# Altium footprint library Apalis Evaluation Board.PcbLib: 166 footprints (part 9 of 11)
Each footprint in its own frame and in the unit in brackets; x right, y up, seen from the top. Pads: shape width x height; smd on the part's side, far side on the other; paste and mask are expansions set on the pad; w line width, h text height; cw(c..) or ccw(c..) is an arc to the next point about the centre after c.
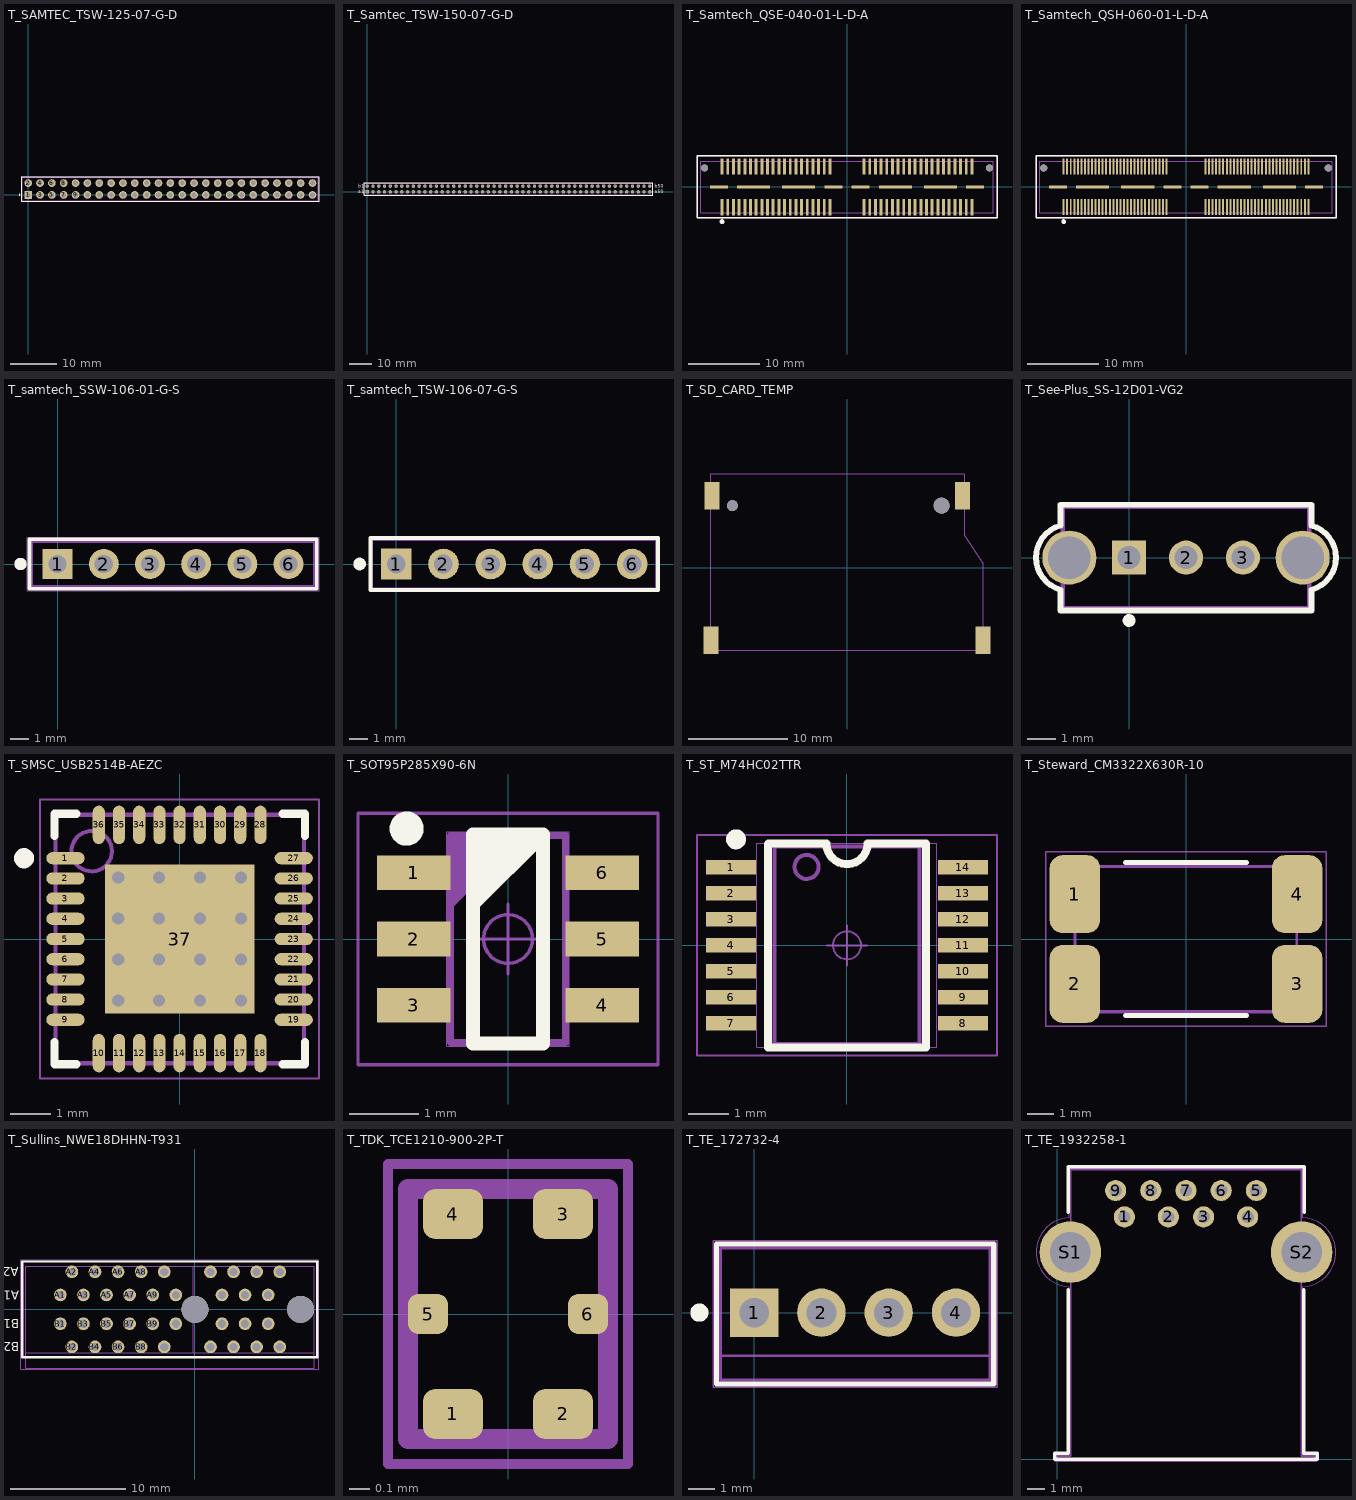
[diagram p8: the footprints below, top view; thin cyan lines are the x and y axes]

## T_SAMTEC_TSW-125-07-G-D [mm] "Header, 2x25 Pins, 2.54 mm pitch"
height 8.51
pads (50):
  rect 1.65x1.65 hole 1.016: 1(0,0)
  round 1.65 hole 1.016: 2(0,2.54)
  round 1.65 hole 1: 3(2.54,0) 4(2.54,2.54) 5(5.08,0) 6(5.08,2.54) 7(7.62,0) 8(7.62,2.54) 9(10.16,0) 10(10.16,2.54) 11(12.7,0) 12(12.7,2.54) 13(15.24,0) 14(15.24,2.54) 15(17.78,0) 16(17.78,2.54) 17(20.32,0) 18(20.32,2.54) 19(22.86,0) 20(22.86,2.54) 21(25.4,0) 22(25.4,2.54) 23(27.94,0) 24(27.94,2.54) 25(30.48,0) 26(30.48,2.54) 27(33.02,0) 28(33.02,2.54) 29(35.56,0) 30(35.56,2.54) 31(38.1,0) 32(38.1,2.54) 33(40.64,0) 34(40.64,2.54) 35(43.18,0) 36(43.18,2.54) 37(45.72,0) 38(45.72,2.54) 39(48.26,0) 40(48.26,2.54) 41(50.8,0) 42(50.8,2.54) 43(53.34,0) 44(53.34,2.54) 45(55.88,0) 46(55.88,2.54) 47(58.42,0) 48(58.42,2.54) 49(60.96,0) 50(60.96,2.54)
Top Overlay:
  circle w0.25: c-1.871,0 r0.1
  lines w0.2: -1.395,-1.395 -1.395,3.935 62.355,3.935 62.355,-1.395 -1.395,-1.395
Mechanical 1:
  circle w0.05: c0,0 r0.35
  lines w0.05: -0.5,0 0.5,0 ; 0,-0.5 0,0.5 ; -1.37,-1.369 62.33,-1.369 62.33,3.91 -1.37,3.91 -1.37,-1.369
Mechanical 2:
  lines w0.001: -1.27,-1.27 -1.27,3.81 62.23,3.81 62.23,-1.27 -1.27,-1.27
Mechanical 3:
  lines w0.1: -1.37,-1.369 -1.37,3.91 62.33,3.91 62.33,-1.369 -1.37,-1.369
3D body: height 8.38, standoff -2.54, extent -1.27,-1.27 62.23,3.81

## T_Samtec_TSW-150-07-G-D [mm] "Header 2x50 pin 2.54mm pitch"
height 10.8
pads (100):
  rect 1.5x1.5 hole 1: 1(0,0)
  round 1.5 hole 1: 2(0,2.54) 3(2.54,0) 4(2.54,2.54) 5(5.08,0) 6(5.08,2.54) 7(7.62,0) 8(7.62,2.54) 9(10.16,0) 10(10.16,2.54) 11(12.7,0) 12(12.7,2.54) 13(15.24,0) 14(15.24,2.54) 15(17.78,0) 16(17.78,2.54) 17(20.32,0) 18(20.32,2.54) 19(22.86,0) 20(22.86,2.54) 21(25.4,0) 22(25.4,2.54) 23(27.94,0) 24(27.94,2.54) 25(30.48,0) 26(30.48,2.54) 27(33.02,0) 28(33.02,2.54) 29(35.56,0) 30(35.56,2.54) 31(38.1,0) 32(38.1,2.54) 33(40.64,0) 34(40.64,2.54) 35(43.18,0) 36(43.18,2.54) 37(45.72,0) 38(45.72,2.54) 39(48.26,0) 40(48.26,2.54) 41(50.8,0) 42(50.8,2.54) 43(53.34,0) 44(53.34,2.54) 45(55.88,0) 46(55.88,2.54) 47(58.42,0) 48(58.42,2.54) 49(60.96,0) 50(60.96,2.54) 51(63.5,0) 52(63.5,2.54) 53(66.04,0) 54(66.04,2.54) 55(68.58,0) 56(68.58,2.54) 57(71.12,0) 58(71.12,2.54) 59(73.66,0) 60(73.66,2.54) 61(76.2,0) 62(76.2,2.54) 63(78.74,0) 64(78.74,2.54) 65(81.28,0) 66(81.28,2.54) 67(83.82,0) 68(83.82,2.54) 69(86.36,0) 70(86.36,2.54) 71(88.9,0) 72(88.9,2.54) 73(91.44,0) 74(91.44,2.54) 75(93.98,0) 76(93.98,2.54) 77(96.52,0) 78(96.52,2.54) 79(99.06,0) 80(99.06,2.54) 81(101.6,0) 82(101.6,2.54) 83(104.14,0) 84(104.14,2.54) 85(106.68,0) 86(106.68,2.54) 87(109.22,0) 88(109.22,2.54) 89(111.76,0) 90(111.76,2.54) 91(114.3,0) 92(114.3,2.54) 93(116.84,0) 94(116.84,2.54) 95(119.38,0) 96(119.38,2.54) 97(121.92,0) 98(121.92,2.54) 99(124.46,0) 100(124.46,2.54)
Top Overlay:
  lines w0.2: -1.395,-1.395 125.855,-1.395 125.855,3.935 -1.395,3.935 -1.395,-1.395
  text "a50" at 126.55,-0.65 h1.52
  text "b50" at 126.55,1.85 h1.52
  text "b1" at -4.07,1.82 h1.52
  text "a1" at -4.069,-0.7 h1.52
Mechanical 1:
  lines w0.05: -1.37,-1.37 125.83,-1.37 125.83,3.91 -1.37,3.91 -1.37,-1.37
Mechanical 2:
  lines w0.001: -1.27,-1.27 125.73,-1.27 125.73,3.81 -1.27,3.81 -1.27,-1.27
Mechanical 3:
  lines w0.1: -1.37,-1.37 -1.37,3.91 125.83,3.91 125.83,-1.37 -1.37,-1.37
3D body: height 8.4, standoff -2.52, extent -1.27,-1.27 125.73,3.81

## T_Samtech_QSE-040-01-L-D-A [mm] "High Speed Ground Plane Socket"
height 3.25
pads (90):
  round 1 hole 1.02 unplated: 0(-20.065,2.67) ""(20.065,2.67)
  rect 0.41x2.27 smd mask+0.05: 1(-17.6,-2.87) 2(-17.6,2.87) 3(-16.8,-2.87) 4(-16.8,2.87) 5(-16,-2.87) 6(-16,2.87) 7(-15.2,-2.87) 8(-15.2,2.87) 9(-14.4,-2.87) 10(-14.4,2.87) 11(-13.6,-2.87) 12(-13.6,2.87) 13(-12.8,-2.87) 14(-12.8,2.87) 15(-12,-2.87) 16(-12,2.87) 17(-11.2,-2.87) 18(-11.2,2.87) 19(-10.4,-2.87) 20(-10.4,2.87) 21(-9.6,-2.87) 22(-9.6,2.87) 23(-8.8,-2.87) 24(-8.8,2.87) 25(-8,-2.87) 26(-8,2.87) 27(-7.2,-2.87) 28(-7.2,2.87) 29(-6.4,-2.87) 30(-6.4,2.87) 31(-5.6,-2.87) 32(-5.6,2.87) 33(-4.8,-2.87) 34(-4.8,2.87) 35(-4,-2.87) 36(-4,2.87) 37(-3.2,-2.87) 38(-3.2,2.87) 39(-2.4,-2.87) 40(-2.4,2.87) 41(2.4,-2.87) 42(2.4,2.87) 43(3.2,-2.87) 44(3.2,2.87) 45(4,-2.87) 46(4,2.87) 47(4.8,-2.87) 48(4.8,2.87) 49(5.6,-2.87) 50(5.6,2.87) 51(6.4,-2.87) 52(6.4,2.87) 53(7.2,-2.87) 54(7.2,2.87) 55(8,-2.87) 56(8,2.87) 57(8.8,-2.87) 58(8.8,2.87) 59(9.6,-2.87) 60(9.6,2.87) 61(10.4,-2.87) 62(10.4,2.87) 63(11.2,-2.87) 64(11.2,2.87) 65(12,-2.87) 66(12,2.87) 67(12.8,-2.87) 68(12.8,2.87) 69(13.6,-2.87) 70(13.6,2.87) 71(14.4,-2.87) 72(14.4,2.87) 73(15.2,-2.87) 74(15.2,2.87) 75(16,-2.87) 76(16,2.87) 77(16.8,-2.87) 78(16.8,2.87) 79(17.6,-2.87) 80(17.6,2.87)
  rect 2.54x0.43 smd mask+0.05: 81(-18.065,0) 81(-1.935,0) 81(1.935,0) 81(18.065,0)
  rect 4.7x0.43 smd mask+0.05: 81(-13.175,0) 81(-6.825,0) 81(6.825,0) 81(13.175,0)
Top Overlay:
  circle w0.5: c-17.6,-4.9 r0.088
  lines w0.2: -21.135,-4.38 21.135,-4.38 21.135,4.38 -21.135,4.38 -21.135,-4.38
Mechanical 1:
  lines w0.05: -21.135,-4.38 21.135,-4.38 21.135,4.38 -21.135,4.38 -21.135,-4.38
Mechanical 2:
  lines w0.01: -20.635,-3.62 20.635,-3.62 20.635,3.62 -20.635,3.62 -20.635,-3.62
Mechanical 3:
  lines w0.1: -20.635,-3.62 20.635,-3.62 20.635,3.62 -20.635,3.62 -20.635,-3.62
3D body: height 3.06, standoff -0.49, extent -20.635,-3.747 20.64,3.746

## T_Samtech_QSH-060-01-L-D-A [mm] "High Speed Ground Plane Socket"
height 3.25
pads (130):
  rect 0.28x2.27 smd: 1(-17.25,-2.865) 2(-17.25,2.865) 3(-16.75,-2.865) 4(-16.75,2.865) 5(-16.25,-2.865) 6(-16.25,2.865) 7(-15.75,-2.865) 8(-15.75,2.865) 9(-15.25,-2.865) 10(-15.25,2.865) 11(-14.75,-2.865) 12(-14.75,2.865) 13(-14.25,-2.865) 14(-14.25,2.865) 15(-13.75,-2.865) 16(-13.75,2.865) 17(-13.25,-2.865) 18(-13.25,2.865) 19(-12.75,-2.865) 20(-12.75,2.865) 21(-12.25,-2.865) 22(-12.25,2.865) 23(-11.75,-2.865) 24(-11.75,2.865) 25(-11.25,-2.865) 26(-11.25,2.865) 27(-10.75,-2.865) 28(-10.75,2.865) 29(-10.25,-2.865) 30(-10.25,2.865) 31(-9.75,-2.865) 32(-9.75,2.865) 33(-9.25,-2.865) 34(-9.25,2.865) 35(-8.75,-2.865) 36(-8.75,2.865) 37(-8.25,-2.865) 38(-8.25,2.865) 39(-7.75,-2.865) 40(-7.75,2.865) 41(-7.25,-2.865) 42(-7.25,2.865) 43(-6.75,-2.865) 44(-6.75,2.865) 45(-6.25,-2.865) 46(-6.25,2.865) 47(-5.75,-2.865) 48(-5.75,2.865) 49(-5.25,-2.865) 50(-5.25,2.865) 51(-4.75,-2.865) 52(-4.75,2.865) 53(-4.25,-2.865) 54(-4.25,2.865) 55(-3.75,-2.865) 56(-3.75,2.865) 57(-3.25,-2.865) 58(-3.25,2.865) 59(-2.75,-2.865) 60(-2.75,2.865) 61(2.75,-2.865) 62(2.75,2.865) 63(3.25,-2.865) 64(3.25,2.865) 65(3.75,-2.865) 66(3.75,2.865) 67(4.25,-2.865) 68(4.25,2.865) 69(4.75,-2.865) 70(4.75,2.865) 71(5.25,-2.865) 72(5.25,2.865) 73(5.75,-2.865) 74(5.75,2.865) 75(6.25,-2.865) 76(6.25,2.865) 77(6.75,-2.865) 78(6.75,2.865) 79(7.25,-2.865) 80(7.25,2.865) 81(7.75,-2.865) 82(7.75,2.865) 83(8.25,-2.865) 84(8.25,2.865) 85(8.75,-2.865) 86(8.75,2.865) 87(9.25,-2.865) 88(9.25,2.865) 89(9.75,-2.865) 90(9.75,2.865) 91(10.25,-2.865) 92(10.25,2.865) 93(10.75,-2.865) 94(10.75,2.865) 95(11.25,-2.865) 96(11.25,2.865) 97(11.75,-2.865) 98(11.75,2.865) 99(12.25,-2.865) 100(12.25,2.865) 101(12.75,-2.865) 102(12.75,2.865) 103(13.25,-2.865) 104(13.25,2.865) 105(13.75,-2.865) 106(13.75,2.865) 107(14.25,-2.865) 108(14.25,2.865) 109(14.75,-2.865) 110(14.75,2.865) 111(15.25,-2.865) 112(15.25,2.865) 113(15.75,-2.865) 114(15.75,2.865) 115(16.25,-2.865) 116(16.25,2.865) 117(16.75,-2.865) 118(16.75,2.865) 119(17.25,-2.865) 120(17.25,2.865)
  rect 2.54x0.43 smd: 121(-18.065,0) 121(-1.935,0) 121(1.935,0) 121(18.065,0)
  rect 4.7x0.43 smd: 121(-13.175,0) 121(-6.825,0) 121(6.825,0) 121(13.175,0)
  round 1.02 hole 1.02 unplated: ""(-20.065,2.67) ""(20.065,2.67)
Top Overlay:
  circle w0.5: c-17.25,-4.895 r0.088
  lines w0.2: -21.15,-4.38 -21.15,4.38 21.15,4.38 21.15,-4.38 -21.15,-4.38
Mechanical 1:
  lines w0.05: -21.15,-4.38 21.15,-4.38 21.15,4.38 -21.15,4.38 -21.15,-4.38
Mechanical 2:
  lines w0.01: -20.65,-3.62 -20.65,3.62 20.65,3.62 20.65,-3.62 -20.65,-3.62
Mechanical 3:
  lines w0.1: -20.65,-3.62 20.65,-3.62 20.65,3.62 -20.65,3.62 -20.65,-3.62
3D body: height 3.27, standoff -0.29, extent -20.637,-3.746 20.638,3.747

## T_samtech_SSW-106-01-G-S [mm] "Receptacle Female Socket, 1x6 Pins, 2.54mm pitch"
height 8.51
pads (6):
  rect 1.65x1.65 hole 1: 1(0,0)
  round 1.65 hole 1: 2(2.54,0) 3(5.08,0) 4(7.62,0) 5(10.16,0) 6(12.7,0)
Top Overlay:
  circle w0.5: c-2.038,0 r0.088
  lines w0.2: -1.55,-1.355 14.25,-1.355 14.25,1.355 -1.55,1.355 -1.55,-1.355
Mechanical 1:
  lines w0.05: -1.675,-1.48 14.375,-1.48 14.375,1.48 -1.675,1.48 -1.675,-1.48
Mechanical 2:
  lines w0.01: -1.4,-1.205 -1.4,1.205 14.1,1.205 14.1,-1.205 -1.4,-1.205
Mechanical 3:
  lines w0.1: -1.4,-1.205 -1.4,1.205 14.1,1.205 14.1,-1.205 -1.4,-1.205
3D body: height 8.52, standoff -2.63, extent -1.524,-1.206 14.224,1.207

## T_samtech_TSW-106-07-G-S [mm] "Connector, Header, 6 Position, 2.54mm pitch"
height 8.4
pads (6):
  rect 1.65x1.65 hole 1: 1(0,0)
  round 1.65 hole 1: 2(2.54,0) 3(5.08,0) 4(7.62,0) 5(10.16,0) 6(12.7,0)
Top Overlay:
  circle w0.5: c-1.975,0 r0.088
  lines w0.2: -1.395,-1.395 -1.395,1.395 14.095,1.395 14.095,-1.395 -1.395,-1.395
Mechanical 1:
  lines w0.05: -1.37,-1.37 -1.37,1.37 14.07,1.37 14.07,-1.37 -1.37,-1.37
Mechanical 2:
  lines w0.01: -1.27,-1.27 -1.27,1.27 13.97,1.27 13.97,-1.27 -1.27,-1.27
Mechanical 3:
  lines w0.1: -1.37,-1.37 14.07,-1.37 14.07,1.37 -1.37,1.37 -1.37,-1.37

## T_SD_CARD_TEMP [mm]
height 2.85
pads (6):
  rect 1.5x2.8 smd: ""(-13.65,-7.25) ""(-13.53,7.25) ""(11.57,7.25) ""(13.65,-7.25)
  round 1.1 hole 1.1: ""(-11.5,6.25)
  round 1.6 hole 1.6: ""(9.5,6.25)
Mechanical 2:
  lines w0.001: -13.68,-8.25 -13.68,9.45 11.82,9.45 11.82,3.25 13.68,0.45 13.68,-8.25 -13.68,-8.25
3D body: height 2.85, standoff 0, extent -13.68,-8.25 13.68,9.45

## T_See-Plus_SS-12D01-VG2 [mm] "Slide Switch"
height 5.5
pads (5):
  rect 1.2x1.2 hole 0.8: 1(0,0)
  round 1.2 hole 0.8: 2(2,0) 3(4,0)
  round 1.9 hole 1.5: ""(-2.1,0) ""(6.1,0)
Top Overlay:
  circle w0.25: c0,-2.21 r0.1
  lines w0.2: -2.423,1.124 ccw(c-2.1,0) -2.422,-1.125 ; -2.41,-1.13 -2.41,-1.86 6.41,-1.86 6.41,-1.13 ; -2.41,1.13 -2.41,1.86 6.41,1.86 6.41,1.13 ; 6.422,1.125 cw(c6.1,0) 6.423,-1.124
Mechanical 1:
  lines w0.05: -2.38,-1.83 -2.38,1.83 6.38,1.83 6.38,-1.83 -2.38,-1.83
Mechanical 2:
  lines w0.001: -2.3,-1.75 -2.3,1.75 6.3,1.75 6.3,-1.75 -2.3,-1.75
Mechanical 3:
  lines w0.1: -2.3,-1.75 6.3,-1.75 6.3,1.75 -2.3,1.75 -2.3,-1.75
3D body: height 6.5, standoff 3.5, extent -0.711,-0.711 0.711,0.711
3D body: height 3.5, standoff 0, extent -2.3,-1.75 6.3,1.75

## T_SMSC_USB2514B-AEZC [mm] "QFN, 36-Leads, Body 6x6mm, Pitch 0.5mm, IPC High Density"
height 1
pads (37):
  oval 0.95x0.3 smd: 1(-2.825,2) 2(-2.825,1.5) 3(-2.825,1) 4(-2.825,0.5) 5(-2.825,0) 6(-2.825,-0.5) 7(-2.825,-1) 8(-2.825,-1.5) 9(-2.825,-2) 19(2.825,-2) 20(2.825,-1.5) 21(2.825,-1) 22(2.825,-0.5) 23(2.825,0) 24(2.825,0.5) 25(2.825,1) 26(2.825,1.5) 27(2.825,2)
  oval 0.3x0.95 smd: 10(-2,-2.825) 11(-1.5,-2.825) 12(-1,-2.825) 13(-0.5,-2.825) 14(0,-2.825) 15(0.5,-2.825) 16(1,-2.825) 17(1.5,-2.825) 18(2,-2.825) 28(2,2.825) 29(1.5,2.825) 30(1,2.825) 31(0.5,2.825) 32(0,2.825) 33(-0.5,2.825) 34(-1,2.825) 35(-1.5,2.825) 36(-2,2.825)
  rect 3.7x3.7 smd paste-3.7: 37(0,0)
via 1.52,1.52 diameter 0.6 hole 0.3
via 1.52,-1.52 diameter 0.6 hole 0.3
via -1.52,-1.52 diameter 0.6 hole 0.3
via -1.52,1.52 diameter 0.6 hole 0.3
via -0.507,1.52 diameter 0.6 hole 0.3
via 0.507,1.52 diameter 0.6 hole 0.3
via -1.52,0.507 diameter 0.6 hole 0.3
via -0.507,0.507 diameter 0.6 hole 0.3
via 0.507,0.507 diameter 0.6 hole 0.3
via 1.52,0.507 diameter 0.6 hole 0.3
via -1.52,-0.507 diameter 0.6 hole 0.3
via -0.507,-0.507 diameter 0.6 hole 0.3
via 0.507,-0.507 diameter 0.6 hole 0.3
via 1.52,-0.507 diameter 0.6 hole 0.3
via -0.507,-1.52 diameter 0.6 hole 0.3
via 0.507,-1.52 diameter 0.6 hole 0.3
Top Overlay:
  circle w0.25: c-3.85,2 r0.125
  lines w0.2: -3.1,-2.55 -3.1,-3.1 -2.55,-3.1 ; -3.1,2.55 -3.1,3.1 -2.55,3.1 ; 2.55,-3.1 3.1,-3.1 3.1,-2.55 ; 2.55,3.1 3.1,3.1 3.1,2.55
Top Paste:
  region: -1.778,0.762 -0.762,0.762 -0.762,1.778 -1.778,1.778
  region: -0.508,0.762 0.508,0.762 0.508,1.778 -0.508,1.778
  region: 0.762,1.778 0.762,0.762 1.778,0.762 1.778,1.778
  region: -1.778,-0.508 -0.762,-0.508 -0.762,0.508 -1.778,0.508
  region: -0.762,-1.778 -0.762,-0.762 -1.778,-0.762 -1.778,-1.778
  region: 0.508,-1.778 0.508,-0.762 -0.508,-0.762 -0.508,-1.778
  region: 1.778,-1.778 1.778,-0.762 0.762,-0.762 0.762,-1.778
  region: 0.509,-0.507 0.509,0.509 -0.507,0.509 -0.507,-0.507
  region: 1.778,-0.508 1.778,0.508 0.762,0.508 0.762,-0.508
Mechanical 1:
  lines w0.05: -3.45,-3.45 3.45,-3.45 3.45,3.45 -3.45,3.45 -3.45,-3.45
Mechanical 2:
  lines w0.001: -3.075,-3.075 3.075,-3.075 3.075,3.075 -3.075,3.075 -3.075,-3.075
Mechanical 3:
  circle w0.1: c-2.175,2.175 r0.5
  lines w0.1: -3.075,-3.075 -3.075,3.075 3.075,3.075 3.075,-3.075 -3.075,-3.075
3D body: height 0.91, standoff 0.01, extent -3.103,-3.103 3.103,3.103

## T_SOT95P285X90-6N [mm]
height 1.45
pads (6):
  rect 1.05x0.5 smd: 1(-1.35,0.95) 2(-1.35,0) 3(-1.35,-0.95) 4(1.35,-0.95) 5(1.35,0) 6(1.35,0.95)
Top Overlay:
  circle w0.25: c-1.453,1.582 r0.12
  lines w0.2: -0.5,0.5 0.5,1.5 ; -0.5,0.7 0.3,1.5 ; -0.5,0.9 0.1,1.5 ; -0.5,1.1 -0.1,1.5 ; -0.5,1.3 -0.3,1.5 ; 0.5,1.5 0.5,-1.5 -0.5,-1.5 -0.5,1.5 0.5,1.5
Mechanical 1:
  circle w0.05: c0,0 r0.35
  lines w0.05: -0.5,0 0.5,0 ; 0,-0.5 0,0.5 ; -2.15,-1.8 2.15,-1.8 2.15,1.8 -2.15,1.8 -2.15,-1.8
Mechanical 2:
  lines w0.001: -0.875,-1.535 0.875,-1.535 0.875,1.535 -0.875,1.535 -0.875,-1.535
Mechanical 3:
  lines w0.1: -0.825,0.485 0.175,1.485 ; -0.825,0.585 0.075,1.485 ; -0.825,0.685 -0.025,1.485 ; -0.825,0.785 -0.125,1.485 ; -0.825,0.885 -0.225,1.485 ; -0.825,0.985 -0.325,1.485 ; -0.825,1.085 -0.425,1.485 ; -0.825,1.185 -0.525,1.485 ; -0.825,1.285 -0.625,1.485 ; -0.825,1.385 -0.725,1.485 ; -0.825,-1.485 0.825,-1.485 0.825,1.485 -0.825,1.485 -0.825,-1.485
3D body: height 1.45, standoff 0, extent -0.875,-1.535 0.875,1.535

## T_ST_M74HC02TTR [mm] "Shrink Small Outline; 14 Leads; Body Width 4.4 mm; Pitch 0.65 mm"
height 1.15
pads (14):
  rect 1.26x0.36 smd: 1(-2.9,1.95) 2(-2.9,1.3) 3(-2.9,0.65) 4(-2.9,0) 5(-2.9,-0.65) 6(-2.9,-1.3) 7(-2.9,-1.95) 8(2.9,-1.95) 9(2.9,-1.3) 10(2.9,-0.65) 11(2.9,0) 12(2.9,0.65) 13(2.9,1.3) 14(2.9,1.95)
Top Overlay:
  circle w0.25: c-2.775,2.65 r0.125
  lines w0.2: -1.97,-2.55 -1.97,2.539 -1.959,2.55 -0.517,2.55 ccw(c0,2.55) 0.517,2.55 1.97,2.55 1.97,-2.55 -1.97,-2.55
Mechanical 1:
  circle w0.05: c0,0 r0.35
  lines w0.05: -0.5,0 0.5,0 ; 0,-0.5 0,0.5 ; -3.75,-2.75 -3.75,2.762 3.75,2.762 3.75,-2.75 -3.75,-2.75
Mechanical 2:
  lines w0.001: -2.25,-2.55 -2.25,2.55 2.25,2.55 2.25,-2.55 -2.25,-2.55
Mechanical 3:
  circle w0.1: c-1.008,1.961 r0.3
  lines w0.1: -1.817,-2.472 1.815,-2.472 1.815,2.466 -1.817,2.466 -1.817,-2.472
3D body: height 1.15, standoff 0, extent -2.25,-2.55 2.25,2.55

## T_Steward_CM3322X630R-10 [mm] "Common Mode Choke"
height 2.85
pads (4):
  rrect50% 1.91x2.95 smd: 1(-4.22,1.705) 2(-4.22,-1.705) 3(4.22,-1.705) 4(4.22,1.705)
Top Overlay:
  lines w0.2: -2.3,-2.902 2.3,-2.902 ; -2.3,2.904 2.3,2.904
Mechanical 1:
  lines w0.05: -5.316,-3.321 -5.316,3.321 5.316,3.321 5.316,-3.321 -5.316,-3.321
Mechanical 2:
  lines w0.001: -4.25,-2.8 -4.25,2.8 4.25,2.8 4.25,-2.8 -4.25,-2.8
Mechanical 3:
  lines w0.1: -4.2,-2.75 -4.2,2.75 4.2,2.75 4.2,-2.75 -4.2,-2.75

## T_Sullins_NWE18DHHN-T931 [mm] "PCIe X1 Slot"
height 8.8
pads (38):
  round 1.1 hole 0.7: A1(-11.65,1.25) A2(-10.65,3.25) A3(-9.65,1.25) A4(-8.65,3.25) A5(-7.65,1.25) A6(-6.65,3.25) A7(-5.65,1.25) A8(-4.65,3.25) A9(-3.65,1.25) A10(-2.65,3.25) A11(-1.65,1.25) A12(1.35,3.25) A13(2.35,1.25) A14(3.35,3.25) A15(4.35,1.25) A16(5.35,3.25) A17(6.35,1.25) A18(7.35,3.25) B1(-11.65,-1.25) B2(-10.65,-3.25) B3(-9.65,-1.25) B4(-8.65,-3.25) B5(-7.65,-1.25) B6(-6.65,-3.25) B7(-5.65,-1.25) B8(-4.65,-3.25) B9(-3.65,-1.25) B10(-2.65,-3.25) B11(-1.65,-1.25) B12(1.35,-3.25) B13(2.35,-1.25) B14(3.35,-3.25) B15(4.35,-1.25) B16(5.35,-3.25) B17(6.35,-1.25) B18(7.35,-3.25)
  round 2.35 hole 2.35 unplated paste+0 mask+0: ""(0,0) ""(9.15,0)
Top Overlay:
  lines w0.2: -14.95,-4.15 -14.95,4.15 10.6,4.15 10.6,-4.15 -14.95,-4.15
  text "B2" at -15.23,-2.835 h0.76
  text "B1" at -15.23,-0.869 h0.76
  text "A2" at -15.23,3.631 h0.76
  text "A1" at -15.23,1.631 h0.76
Mechanical 1:
  lines w0.05: -15.1,-5.2 10.75,-5.2 10.75,4.3 -15.1,4.3 -15.1,-5.2
Mechanical 2:
  lines w0.01: -14.65,-3.75 10.35,-3.75 ; -0.15,-3.75 -0.15,3.75 ; -14.65,-5.1 -14.65,3.75 10.35,3.75 10.35,-5.1 -14.65,-5.1
Mechanical 3:
  lines w0.1: -14.65,-3.75 10.35,-3.75 ; -14.65,-5.1 10.35,-5.1 10.35,3.75 -14.65,3.75 -14.65,-5.1
3D body: height 11.04, standoff -4.38, extent -14.63,-4.864 10.363,3.747

## T_TDK_TCE1210-900-2P-T [mm] "Common Mode Choke Super Speed"
height 0.57
pads (6):
  rrect50% 0.3x0.25 smd: 1(-0.275,-0.5) 2(0.275,-0.5) 3(0.275,0.5) 4(-0.275,0.5)
  rrect50% 0.2x0.2 smd: 5(-0.4,0) 6(0.4,0)
Mechanical 1:
  lines w0.05: -0.6,-0.75 -0.6,0.75 0.6,0.75 0.6,-0.75 -0.6,-0.75
Mechanical 2:
  lines w0.01: -0.5,-0.625 0.5,-0.625 0.5,0.625 -0.5,0.625 -0.5,-0.625
Mechanical 3:
  lines w0.1: -0.5,-0.625 0.5,-0.625 0.5,0.625 -0.5,0.625 -0.5,-0.625
3D body: height 0.57, standoff 0, extent -0.5,-0.625 0.5,0.625

## T_TE_172732-4 [mm] "Header vertical with kink, 1x4 Pins, 2.54mm pitch"
height 10.4
pads (4):
  rect 1.8x1.8 hole 1.1: 1(0,0)
  round 1.8 hole 1.1: 2(2.5,0) 3(5,0) 4(7.5,0)
Top Overlay:
  circle w0.5: c-2.038,0 r0.088
  lines w0.2: -1.4,-2.65 -1.4,2.55 8.9,2.55 8.9,-2.65 -1.4,-2.65
Mechanical 1:
  lines w0.05: -1.525,-2.775 -1.525,2.675 9.025,2.675 9.025,-2.775 -1.525,-2.775
Mechanical 2:
  lines w0.01: -1.25,-2.5 -1.25,2.4 8.75,2.4 8.75,-2.5 -1.25,-2.5
Mechanical 3:
  lines w0.1: -1.25,-1.6 8.75,-1.6 ; -1.25,-2.5 8.75,-2.5 8.75,2.4 -1.25,2.4 -1.25,-2.5
3D body: height 10.42, standoff -3.28, extent -1.25,-2.5 8.75,2.4

## T_TE_1932258-1 [mm] "USB 3.0, Type A"
height 7.25
pads (11):
  round 1.2 hole 0.7: 1(3.815,13.78) 2(6.315,13.78) 3(8.315,13.78) 4(10.815,13.78) 5(11.315,15.28) 6(9.315,15.28) 7(7.315,15.28) 8(5.315,15.28) 9(3.315,15.28)
  round 3.5 hole 2.3: S1(0.745,11.78) S2(13.885,11.78)
Top Overlay:
  lines w0.2: 0.615,9.65 0.615,0.36 -0.15,0.36 -0.15,0 14.78,0 14.78,0.36 14.015,0.36 14.015,9.65 ; 0.615,14.06 0.615,16.63 14.02,16.63 14.02,14.06
Mechanical 1:
  lines w0.05: 0.67,13.735 ccw(c0.75,11.779) 0.67,9.823 0.67,0.299 -0.105,0.299 -0.105,-0.099 14.735,-0.099 14.735,0.299 13.96,0.299 13.96,9.824 ccw(c13.88,11.78) 13.959,13.736 13.96,16.575 0.67,16.575 0.67,13.735
Mechanical 2:
  lines w0.001: 0,0 0,0.2 0.765,0.2 0.765,16.48 13.865,16.48 13.865,0.2 14.63,0.2 14.63,0 0,0
Mechanical 3:
  lines w0.1: 0,0 0,0.2 0.765,0.2 0.765,16.48 13.865,16.48 13.865,0.2 14.63,0.2 14.63,0 0,0
3D body: height 7.77, standoff -3.68, extent -0.731,0 15.362,16.48